# Altium footprint library Pasivos.PcbLib: 55 footprints (part 1 of 4)
Each footprint in its own frame and in the unit in brackets; x right, y up, seen from the top. Pads: shape width x height; smd on the part's side, far side on the other; paste and mask are expansions set on the pad; w line width, h text height; cw(c..) or ccw(c..) is an arc to the next point about the centre after c.
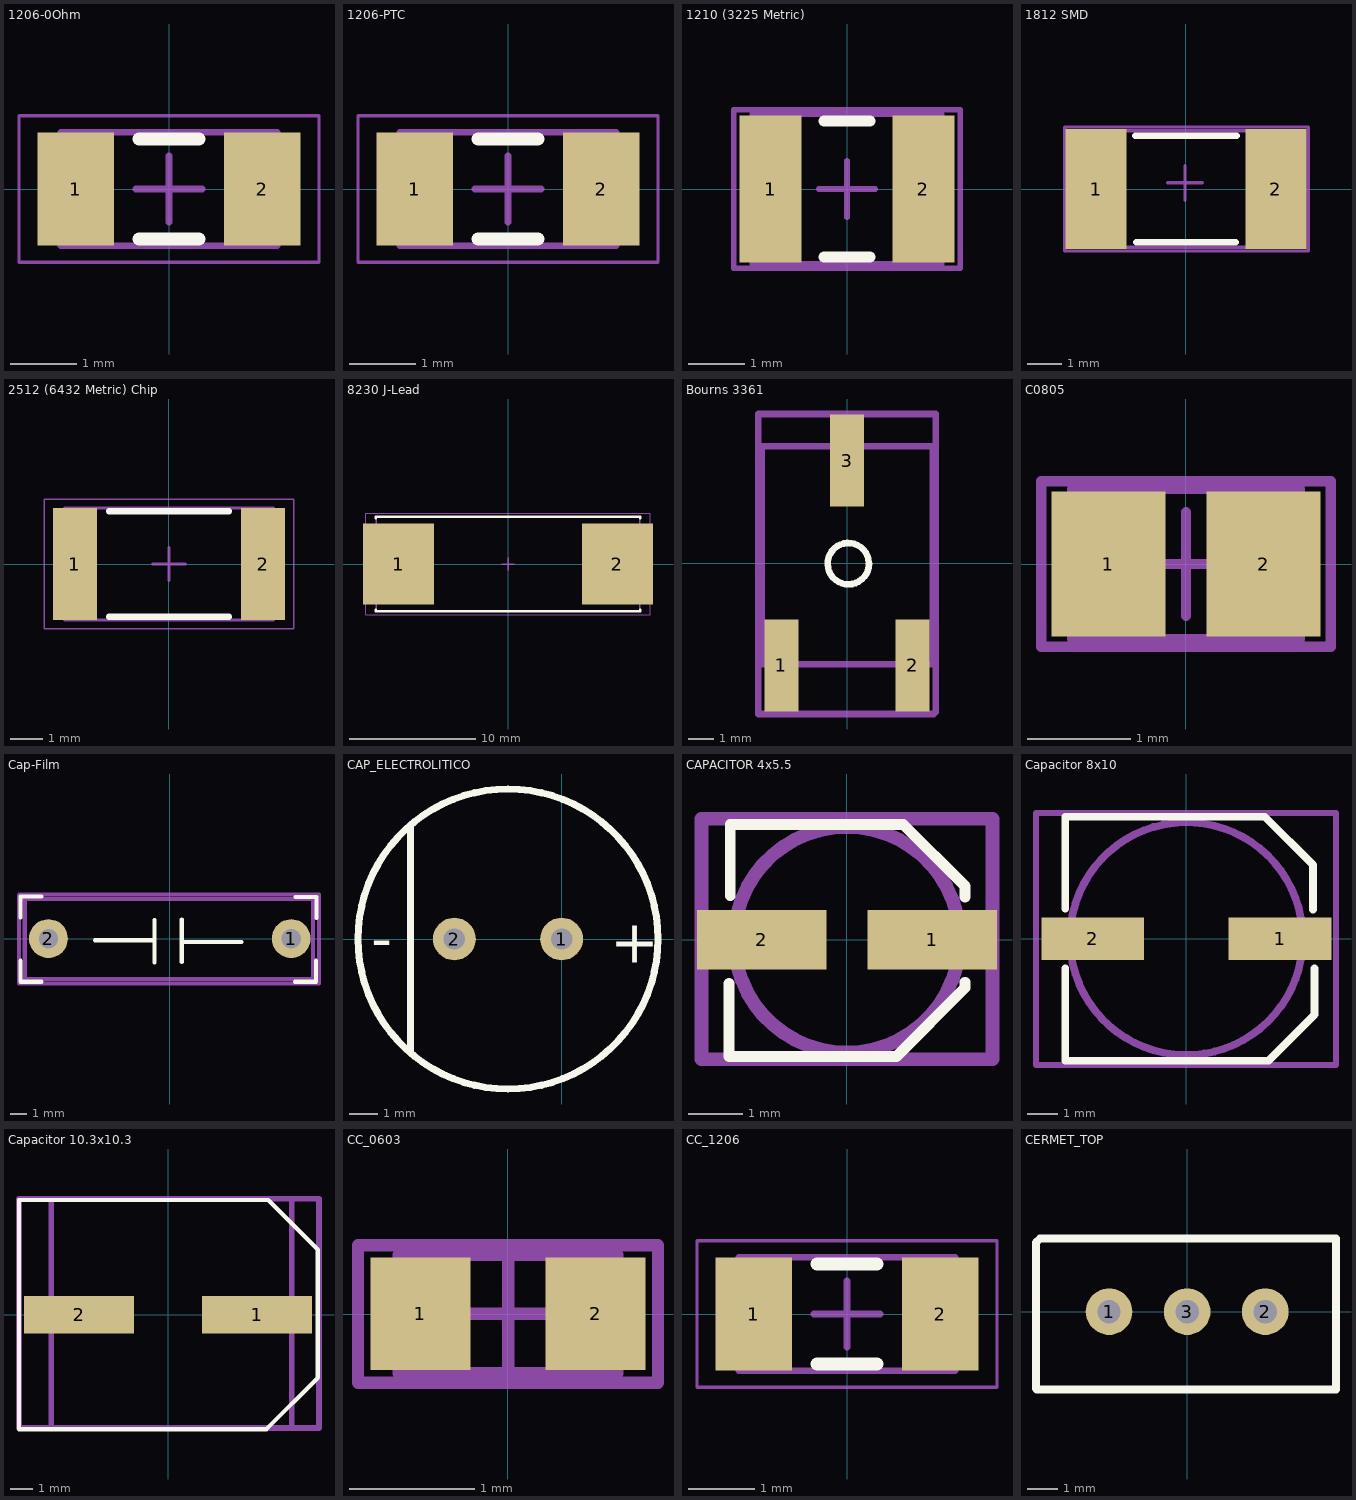
[diagram p0: the footprints below, top view; thin cyan lines are the x and y axes]

## 1206-0Ohm [mm] "Puente 1206"
height 0.65
pads (2):
  rect 1.15x1.7 smd: 1(-1.4,0) 2(1.4,0)
Top Overlay:
  lines w0.2: -0.45,-0.75 0.45,-0.75 ; -0.45,0.75 0.45,0.75
Mechanical 13:
  lines w0.1: -1.625,-0.85 -1.625,0.85 1.625,0.85 1.625,-0.85 -1.625,-0.85
Mechanical 15:
  lines w0.05: -2.25,-1.1 -2.25,1.1 2.25,1.1 2.25,-1.1 -2.25,-1.1
  lines w0.1: -0.5,0 0.5,0 ; 0,-0.5 0,0.5
3D body: height 1, standoff 0, extent -1.651,-0.8 1.549,0.8

## 1206-PTC [mm] "PTC Resettable Fuse Surface Mount 1206 (3216 Metric), Concave"
height 0.65
pads (2):
  rect 1.15x1.7 smd: 1(-1.4,0) 2(1.4,0)
Top Overlay:
  lines w0.2: -0.45,-0.75 0.45,-0.75 ; -0.45,0.75 0.45,0.75
Mechanical 13:
  lines w0.1: -1.625,-0.85 1.625,-0.85 1.625,0.85 -1.625,0.85 -1.625,-0.85
Mechanical 15:
  lines w0.05: -2.25,-1.1 2.25,-1.1 2.25,1.1 -2.25,1.1 -2.25,-1.1
  lines w0.1: -0.5,0 0.5,0 ; 0,-0.5 0,0.5
3D body: height 0.56, standoff 0, extent -1.576,-0.801 1.626,0.851

## 1210 (3225 Metric) [mm] "Chip Resistor, Body 3.2x2.5mm, IPC High Density"
height 0.9
pads (2):
  rect 1.1x2.6 smd: 1(-1.35,0) 2(1.35,0)
Top Overlay:
  lines w0.2: -0.4,-1.2 0.4,-1.2 ; -0.4,1.2 0.4,1.2
Mechanical 13:
  lines w0.1: -1.675,-1.32 1.675,-1.32 1.675,1.32 -1.675,1.32 -1.675,-1.32
Mechanical 15:
  lines w0.1: -0.5,0 0.5,0 ; 0,-0.5 0,0.5 ; -2,-1.4 2,-1.4 2,1.4 -2,1.4 -2,-1.4
3D body: height 0.95, standoff 0, extent -1.607,-1.262 1.607,1.313

## 1812 SMD [mm] "Chip Capacitor, Body 4.5x3.2mm, IPC High Density"
height 1.4
pads (2):
  rect 1.78x3.5 smd: 1(-2.615,0) 2(2.615,0)
Top Overlay:
  lines w0.2: -1.464,1.55 1.469,1.549 ; -1.439,-1.55 1.444,-1.549
Mechanical 13:
  lines w0.1: -2.671,-1.7 -2.671,1.7 2.765,1.7 2.765,-1.7 -2.671,-1.7
Mechanical 15:
  lines w0.1: -0.529,0.178 0.471,0.178 ; -0.029,-0.322 -0.029,0.678 ; -3.534,-1.803 -3.534,1.803 3.552,1.803 3.552,-1.803 -3.534,-1.803
3D body: height 1.25, standoff 0.05, extent -2.254,-1.6 2.246,1.6

## 2512 (6432 Metric) Chip [mm] "Chip Resistor, 2-Leads, Body 6.30x3.25mm, IPC Medium Density"
height 0.7
pads (2):
  rect 1.35x3.45 smd: 1(-2.9,0) 2(2.9,0)
Top Overlay:
  lines w0.2: -1.85,-1.625 1.85,-1.625 ; -1.85,1.625 1.85,1.625
Mechanical 13:
  lines w0.1: -3.225,-1.725 -3.225,1.725 3.225,1.725 3.225,-1.725 -3.225,-1.725
Mechanical 15:
  lines w0.05: -3.85,-2 -3.85,2 3.85,2 3.85,-2 -3.85,-2
  lines w0.1: -0.5,0 0.5,0 ; 0,-0.5 0,0.5
3D body: height 0.62, standoff 0, extent -3.124,-1.575 3.195,1.626

## 8230 J-Lead [mm] "Molded Resistor, 2-Leads, Body 20.80x7.50mm, IPC Medium Density"
height 7.7
pads (2):
  rect 5.6x6.4 smd: 1(-8.65,0) 2(8.65,0)
Top Overlay:
  lines w0.2: -10.45,-3.6 -10.45,-3.75 10.45,-3.75 10.45,-3.6 ; -10.45,3.6 -10.45,3.75 10.45,3.75 10.45,3.6
Mechanical 13:
  lines w0.1: -10.4,-3.75 -10.4,3.75 10.4,3.75 10.4,-3.75 -10.4,-3.75
Mechanical 15:
  lines w0.05: -11.225,-4 -11.225,4 11.225,4 11.225,-4 -11.225,-4
  lines w0.1: -0.5,0 0.5,0 ; 0,-0.5 0,0.5
3D body: height 7.7, standoff 0, extent -10.4,-3.75 10.4,3.75

## Bourns 3361 [mm] "3361 - 1/4 ” Square SMD Trimpot® Trimming Potentiometer"
pads (3):
  rect 1.31x3.55 smd: 1(-2.54,-3.962) 2(2.54,-3.962) 3(0,3.963)
Top Overlay:
  lines w0.254: 0.849,0.021 ccw(c0.051,-0.025) 0.851,-0.025
Mechanical 13:
  lines w0.254: -3.302,-3.912 3.327,-3.912 3.327,4.521 -3.302,4.521 -3.302,-3.912
Mechanical 15:
  lines w0.254: -3.429,-5.842 3.353,-5.842 3.429,-5.766 3.429,5.766 -3.429,5.766 -3.429,-5.842
3D body: height 5.16, standoff -0.07, extent -3.239,-4.039 3.467,4.496

## C0805 [mm] "Chip Capacitor, Body 2.0x1.3mm, IPC High Density"
height 1.4
pads (2):
  rect 1.1x1.4 smd: 1(-0.75,0) 2(0.75,0)
Mechanical 13:
  lines w0.1: -1.1,-0.725 1.1,-0.725 1.1,0.725 -1.1,0.725 -1.1,-0.725
Mechanical 15:
  lines w0.1: -0.5,0 0.5,0 ; 0,-0.5 0,0.5 ; -1.4,-0.8 1.4,-0.8 1.4,0.8 -1.4,0.8 -1.4,-0.8
3D body: height 0.78, standoff 0, extent -1.025,-0.615 0.975,0.635

## Cap-Film [mm] "Metallized polypropylene film capacitors (MFP)"
pads (2):
  round 2.4 hole 1.2: 1(7.5,0) 2(-7.5,0)
Top Overlay:
  lines w0.254: -9.22,-1.372 -9.22,-2.667 -7.925,-2.667 ; -9.22,1.295 -9.22,2.591 -7.925,2.591 ; -4.623,-0.102 -0.94,-0.102 ; -0.94,-1.473 -0.94,1.143 ; 0.737,-1.448 0.737,1.168 ; 0.737,-0.203 4.42,-0.203 ; 7.747,-2.667 9.042,-2.667 9.042,-1.372 ; 7.772,2.565 9.068,2.565 9.068,1.27
Mechanical 13:
  lines w0.254: -9.068,2.438 8.839,2.438 8.839,-2.489 -8.966,-2.489 -8.966,2.337
Mechanical 15:
  lines w0.254: -9.322,2.692 -9.322,-2.769 9.22,-2.769 9.22,2.718 -9.296,2.718
3D body: height 11, standoff -2.6, extent -9.068,-2.551 8.932,2.449

## CAP_ELECTROLITICO [mil] "Capacitor Electrolítico 470uF x 25V"
pads (2):
  round 60 hole 30: 1(0,0) 2(-150.39,0)
Top Overlay:
  circle w10: c-75.19,0 r210.43
  lines w10: -211.77,-156.41 -211.77,157.59
  text "-" at -266.77,-27.41 h60
  text "+" at 68.23,-33.41 h60
3D body: height 566.93, standoff -114.17, extent -236.19,-161.83 86.65,161.01

## CAPACITOR 4x5.5 [mm] "SMD Aluminum Capacitor D=4mm,H=5.5mm, 4.3x4.3 [mm2], 10uF x 16V"
pads (2):
  rect 2.4x1.1 smd: 1(1.575,0) 2(-1.575,0)
Top Overlay:
  lines w0.2: -2.184,-0.813 -2.184,-2.159 0.914,-2.159 2.184,-0.889 2.184,-0.787 ; -2.159,0.813 -2.159,2.134 1.041,2.134 2.184,0.991 2.184,0.787
Mechanical 13:
  circle w0.254: c0,0 r2.086
Mechanical 15:
  lines w0.254: -2.692,-2.21 2.692,-2.21 2.692,2.235 -2.692,2.235 -2.692,-2.21
3D body: height 6.42, standoff 0, extent -2.525,-2.134 2.475,2.166

## Capacitor 8x10 [mm] "SMD Aluminum Capacitor D=8.3mm,H=10mm, 8.3x8.3 [mm2], 470uF x 35V"
pads (2):
  rect 3.4x1.4 smd: 1(3.1,0) 2(-3.1,0)
Top Overlay:
  lines w0.254: -4.013,-0.991 -4.013,-3.937 -4.013,-4.039 2.718,-4.039 4.242,-2.515 4.242,-0.991 ; -4.013,0.991 -4.013,4.039 2.591,4.039 4.191,2.438 4.191,0.965
Mechanical 13:
  circle w0.254: c0,0 r3.852
Mechanical 15:
  lines w0.2: -4.978,-4.191 4.953,-4.191 4.953,4.166 -4.978,4.166 -4.978,-4.191
3D body: height 6.2, standoff 0, extent -4.551,-4.175 4.449,4.125

## Capacitor 10.3x10.3 [mm] "Aluminum Electrolytic Capacitors FKS Panasonic"
pads (2):
  rect 5x1.7 smd: 1(4.05,0) 2(-4.05,0)
Top Overlay:
  lines w0.2: -6.779,-5.207 -6.779,5.207 4.549,5.207 6.81,2.946 6.81,-2.87 4.473,-5.207 -6.779,-5.207
Mechanical 13:
  lines w0.254: -5.331,5.258 5.616,5.258 5.616,-5.156 -5.306,-5.156 -5.306,5.258
Mechanical 15:
  lines w0.254: -6.779,-5.156 -6.779,5.258 6.861,5.258 6.861,-5.156 -6.779,-5.156
3D body: height 10.41, standoff 0, extent -5.294,-5.149 5.706,5.251

## CC_0603 [mm] "Chip Capacitor, Body 1.6x0.8mm, IPC High Density"
height 1.3
pads (2):
  rect 0.8x0.9 smd: 1(-0.7,0) 2(0.7,0)
Mechanical 13:
  lines w0.1: -0.875,-0.475 0.875,-0.475 0.875,0.475 -0.875,0.475 -0.875,-0.475
Mechanical 15:
  lines w0.1: -0.475,0 0.475,0 ; 0,-0.475 0,0.475 ; -1.2,-0.55 1.2,-0.55 1.2,0.55 -1.2,0.55 -1.2,-0.55
3D body: height 0.81, standoff -0.01, extent -0.774,-0.41 0.826,0.41

## CC_1206 [mm] "Capacitor ceramico SMD Y5V 50V"
height 0.65
pads (2):
  rect 1.15x1.7 smd: 1(-1.4,0) 2(1.4,0)
Top Overlay:
  lines w0.2: -0.45,-0.75 0.45,-0.75 ; -0.45,0.75 0.45,0.75
Mechanical 13:
  lines w0.1: -1.625,-0.85 -1.625,0.85 1.625,0.85 1.625,-0.85 -1.625,-0.85
Mechanical 15:
  lines w0.05: -2.25,-1.1 -2.25,1.1 2.25,1.1 2.25,-1.1 -2.25,-1.1
  lines w0.1: -0.5,0 0.5,0 ; 0,-0.5 0,0.5
3D body: height 1, standoff 0, extent -1.651,-0.8 1.549,0.8

## CERMET_TOP [mil] "Cermet serie 3296W aj. vertical"
pads (3):
  round 60 hole 30: 1(-100.5,0) 2(100.5,0) 3(0,0)
Top Overlay:
  lines w10: -194.5,-99 -194.5,89 -189.5,94 191.5,94 191.5,-100 -193.5,-100
3D body: height 460.6, standoff -112.4, extent -188.5,-97 187.5,93